# Altium footprint library 容阻感.PcbLib: 66 footprints (part 3 of 5)
Each footprint in its own frame and in the unit in brackets; x right, y up, seen from the top. Pads: shape width x height; smd on the part's side, far side on the other; paste and mask are expansions set on the pad; w line width, h text height; cw(c..) or ccw(c..) is an arc to the next point about the centre after c.
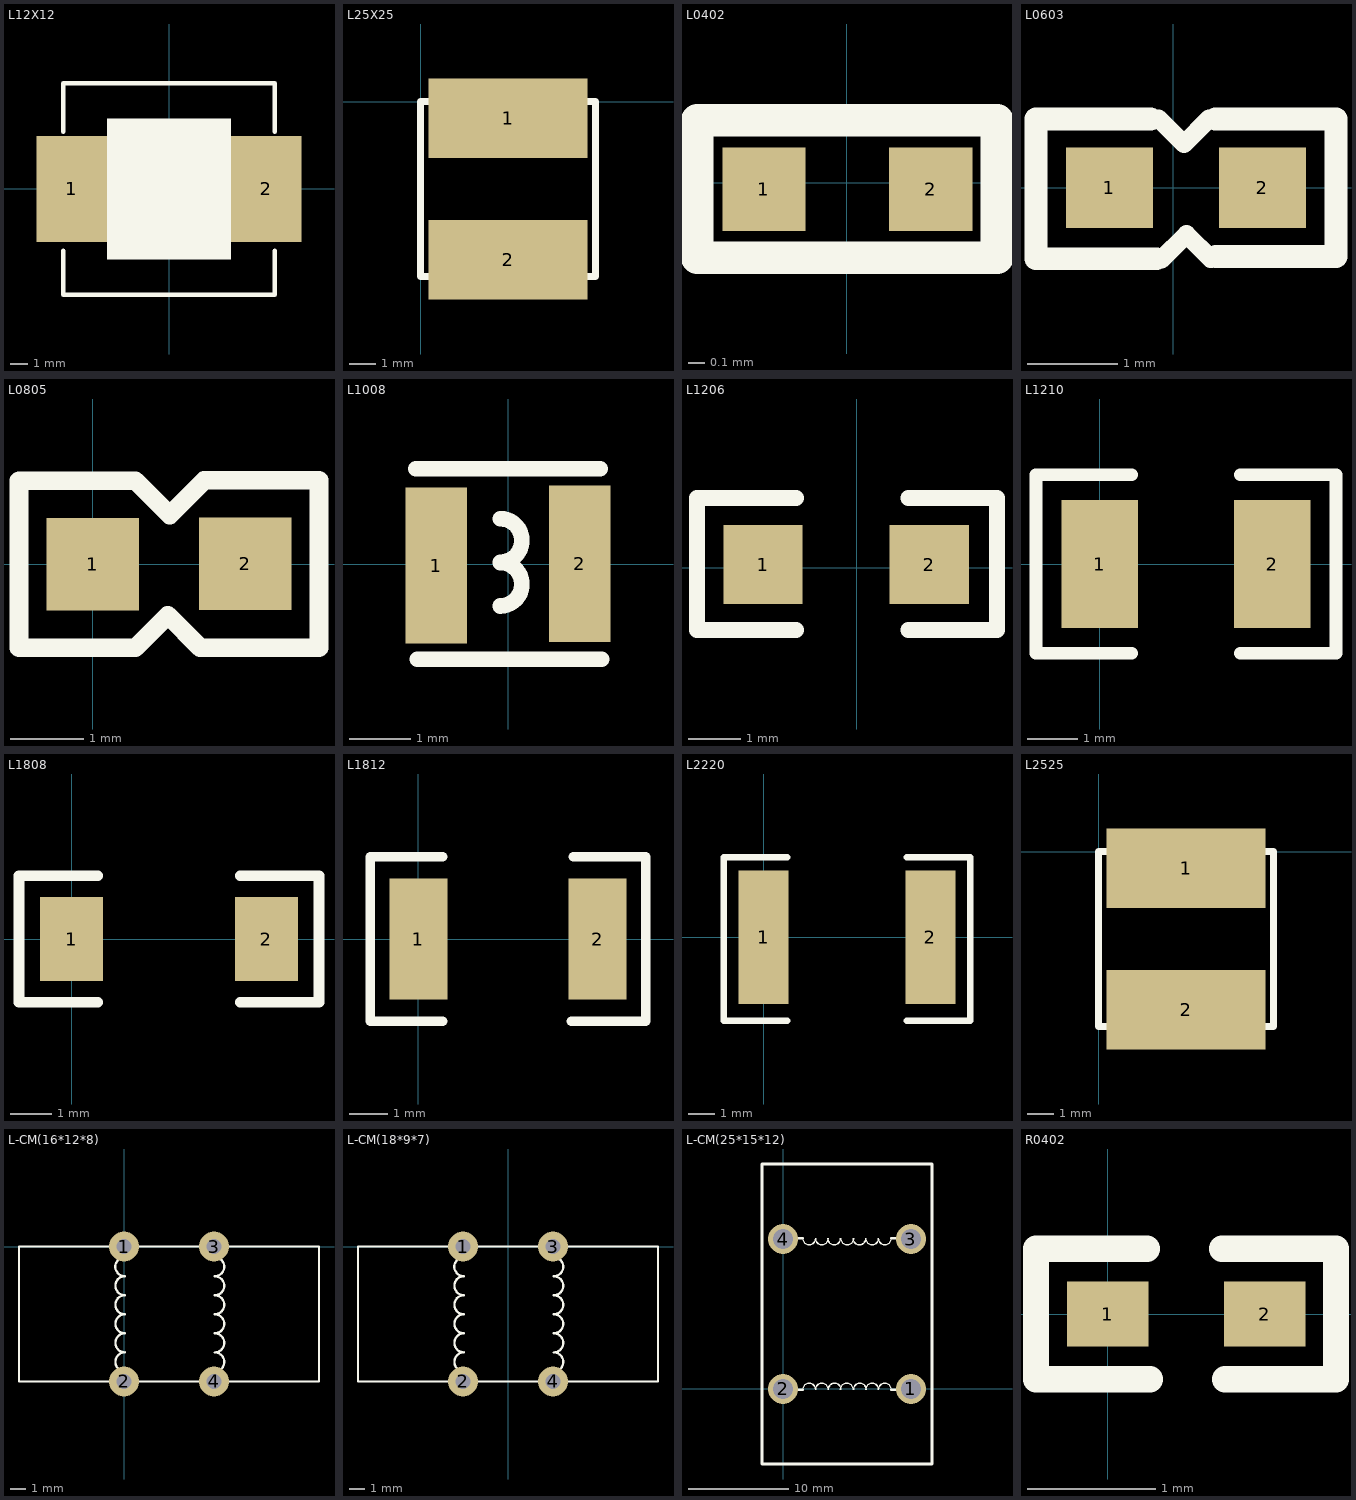
[diagram p2: the footprints below, top view; thin cyan lines are the x and y axes]

## L12X12 [mm]
height 7
pads (2):
  rect 4x6 smd: 1(-5.5,0) 2(5.5,0)
Top Overlay:
  rectangle: -3.5,-4 3.5,4
  lines w0.254: -6,-3.5 -6,-6 6,-6 6,-3.5 ; -6,3.25 -6,6 6,6 6,3.25
3D body "User Library-MSS1260.STEP": height 6.1, standoff -0.05, extent -6.15,-6.15 6.15,6.15

## L25X25 [mm]
pads (2):
  rect 6x3 smd: 1(3.302,-0.635) 2(3.302,-5.969)
Top Overlay:
  lines w0.254: 0,-6.604 6.604,-6.604 6.604,0 0,0 0,-6.604
3D body "电感.STEP": height 4.5, standoff -0.01, extent 0.702,-6.133 5.902,-0.42

## L0402 [mil] "1/16W"
pads (2):
  rect 20x20 smd: 1(-19.93,-1.58) 2(20.07,-1.58)
Top Overlay:
  lines w7.87: -36,-18 -36,15 36,15 36,-18 -36,-18
3D body: height 10, standoff 0, extent -16.5,-11.58 16.5,8.42
3D body: height 10, standoff 0, extent -19.5,-11.58 -16.5,8.42
3D body: height 10, standoff 0, extent 16.5,-11.58 19.5,8.42

## L0603 [mil]
pads (2):
  rect 38x35 smd: 1(-28,0) 2(38.87,0)
Top Overlay:
  lines w8: -6.53,30.27 4.6,19.14 15.58,30.12 ; -5.3,-31.36 5.7,-20.36 16.32,-30.98
  lines w10: -9.9,30 -60,30 -60,-31 -7.3,-31 ; 18.4,30 71,30 71,-30 18.6,-30
3D body: height 20, standoff 0, extent -16,-15 28,15
3D body: height 20, standoff 0, extent 28,-15 36,15
3D body: height 20, standoff 0, extent -24,-15 -16,15

## L0805 [mm] "1/8W"
pads (2):
  rect 1.27x1.27 smd: 1(0,0) 2(2.09,0.005)
Top Overlay:
  lines w0.254: -1.011,-1.143 0.584,-1.143 1.029,-0.699 1.473,-1.143 3.099,-1.143 3.099,1.148 1.529,1.148 1.054,0.673 0.584,1.143 -1.011,1.143 -1.011,-1.143
3D body "R0805.STEP": height 0.55, standoff 0, extent 0.036,-0.62 2.036,0.64

## L1008 [mil] "2520"
height 209.84
pads (2):
  rect 39.37x100 smd: 1(-46,-1) 2(46,0.13)
Top Overlay:
  lines w10: -59.06,61 59.06,61 ; -58.11,-61 60,-61 ; -5,-26.86 ccw(c-5,-12.93) -5,1 ; -5,1.14 ccw(c-5,15.07) -5,29
3D body "AISC-1008F.STEP": height 91.14, standoff 0.09, extent -57.48,-54.92 57.48,54.93

## L1206 [mil] "1/4W"
pads (2):
  rect 60x60 smd: 1(-70.98,2.53) 2(55,2.53)
Top Overlay:
  lines w12: -46,-47 -121,-47 -121,53 -46,53 ; 39,-47 106.3,-47 106.3,53 39,53
3D body "V1206HD.STEP": height 62.99, standoff 0, extent -70.98,-27 55,32.06

## L1210 [mil]
pads (2):
  rect 60x100 smd: 1(0,0) 2(135,0)
Top Overlay:
  lines w10: 25,-70 -50,-70 -50,70 25,70 ; 110,-70 185,-70 185,70 110,70
3D body "L1210.STEP": height 78.74, standoff 0, extent 7.09,-51.96 131.11,46.48

## L1808 [mil]
pads (2):
  rect 60x80 smd: 1(0,0) 2(185,0)
Top Overlay:
  lines w10: 25,-60 -50,-60 -50,60 25,60 ; 160,-60 235,-60 235,60 160,60
3D body "R1808(4520M)1.STEP": height 39.37, standoff 0, extent 2,-39 179.77,37.49

## L1812 [mil]
pads (2):
  rect 60x125 smd: 1(0,0) 2(185,0)
Top Overlay:
  lines w10: 25,-85 -50,-85 -50,85 25,85 ; 158,-85 160,-85 235,-85 235,85 160,85 ; 159,-85 161,-85
3D body "L1812.STEP": height 118.11, standoff -2.01, extent 1.89,-63 184.11,62.98

## L2220 [mm]
pads (2):
  rect 1.905x5.08 smd: 1(0,0) 2(6.35,0)
Top Overlay:
  lines w0.254: 0.889,-3.175 -1.524,-3.175 -1.524,3.048 0.889,3.048 ; 5.461,-3.175 7.874,-3.175 7.874,3.048 5.461,3.048
3D body "L2220.STEP": height 2.5, standoff 0, extent 0.3,-2.489 6,2.511

## L2525 [mm]
pads (2):
  rect 6x3 smd: 1(3.302,-0.635) 2(3.302,-5.969)
Top Overlay:
  lines w0.254: 0,-6.604 0,0 6.604,0 6.604,-6.604 0,-6.604
3D body "电感.STEP": height 4.5, standoff -0.01, extent 0.702,-6.133 5.902,-0.42

## L-CM(16*12*8) [mm]
pads (4):
  round 2 hole 1: 1(0,0) 2(0,-9) 3(6,0) 4(6,-9)
Top Overlay:
  lines w0.15: 0.057,-1.982 cw(c0.057,-1.347) 0.057,-0.712 ; 0.059,-7.059 cw(c0.059,-6.424) 0.059,-5.789 cw(c0.059,-5.154) 0.059,-4.519 ; 0.058,-4.52 cw(c0.058,-3.885) 0.058,-3.25 ; 0.058,-3.251 cw(c0.058,-2.616) 0.058,-1.981 ; 0.06,-8.328 cw(c0.06,-7.693) 0.06,-7.058 ; 6.047,-4.523 ccw(c6.047,-3.888) 6.047,-3.253 ccw(c6.047,-2.618) 6.047,-1.983 ; 6.046,-1.984 ccw(c6.046,-1.349) 6.046,-0.714 ; 6.048,-7.061 ccw(c6.048,-6.426) 6.048,-5.791 ; 6.048,-5.792 ccw(c6.048,-5.157) 6.048,-4.522 ; 6.049,-8.33 ccw(c6.049,-7.695) 6.049,-7.06 ; -7,-9 -7,0 13,0 13,-9 -7,-9
3D body "变?": height 16.27, standoff -5.58, extent -5.775,-9.446 11.775,0.446

## L-CM(18*9*7) [mm]
pads (4):
  round 2 hole 1: 1(-3,0) 2(-3,-9) 3(3,0) 4(3,-9)
Top Overlay:
  lines w0.15: -2.942,-4.52 cw(c-2.942,-3.885) -2.942,-3.25 ; -2.942,-3.251 cw(c-2.942,-2.616) -2.942,-1.981 ; -2.943,-1.982 cw(c-2.943,-1.347) -2.943,-0.712 ; -2.941,-7.059 cw(c-2.941,-6.424) -2.941,-5.789 cw(c-2.941,-5.154) -2.941,-4.519 ; -2.94,-8.328 cw(c-2.94,-7.693) -2.94,-7.058 ; 3.046,-1.984 ccw(c3.046,-1.349) 3.046,-0.714 ; 3.047,-4.523 ccw(c3.047,-3.888) 3.047,-3.253 ccw(c3.047,-2.618) 3.047,-1.983 ; 3.048,-7.061 ccw(c3.048,-6.426) 3.048,-5.791 ; 3.048,-5.792 ccw(c3.048,-5.157) 3.048,-4.522 ; 3.049,-8.33 ccw(c3.049,-7.695) 3.049,-7.06 ; -10,-9 10,-9 10,0 -10,0 -10,-9
3D body "变?": height 16.27, standoff -5.58, extent -8.775,-9.446 8.775,0.446

## L-CM(25*15*12) [mm]
pads (4):
  round 3 hole 2: 1(12.8,0) 2(0,0) 3(12.8,15) 4(0,15)
Top Overlay:
  lines w0.15: 1.981,-0.058 cw(c2.616,-0.058) 3.251,-0.058 ; 1.981,15.058 ccw(c2.616,15.058) 3.251,15.058 ; 3.25,-0.058 cw(c3.885,-0.058) 4.52,-0.058 ; 3.25,15.058 ccw(c3.885,15.058) 4.52,15.058 ; 4.472,15.06 ccw(c5.107,15.06) 5.742,15.06 ; 4.519,-0.059 cw(c5.154,-0.059) 5.789,-0.059 ; 5.741,-0.059 cw(c6.376,-0.059) 7.011,-0.059 ; 5.789,15.059 ccw(c6.424,15.059) 7.059,15.059 ; 7.011,15.059 ccw(c7.646,15.059) 8.281,15.059 ccw(c8.915,15.058) 9.55,15.058 ; 7.058,-0.06 cw(c7.693,-0.06) 8.328,-0.06 ; 8.28,-0.058 cw(c8.915,-0.058) 9.55,-0.058 ; 9.549,-0.058 cw(c10.184,-0.058) 10.819,-0.058 ; 9.549,15.058 ccw(c10.184,15.058) 10.819,15.058
  lines w0.254: 0.058,-0.058 1.981,-0.058 ; 0.058,15.058 1.981,15.058 ; 10.819,-0.058 12.742,-0.058 ; 10.819,15.058 12.742,15.058 ; -2.1,-7.5 -2.1,22.5 14.9,22.5 14.9,-7.5 -2.1,-7.5
3D body "零?": height 27, standoff -5, extent -2.1,-7.002 14.9,22.002

## R0402 [mil] "1/16W"
pads (2):
  rect 25x20 smd: 1(0,0) 2(48.2,0)
Top Overlay:
  lines w8: 12,20 -22,20 -22,-20 13,-20 ; 35,20 70,20 70,-20 36,-20
3D body "R0402.STEP": height 13.78, standoff 0, extent 4.71,-9.79 44.09,9.9